# Altium integrated library Mastermind.IntLib: 985 symbols (part 4 of 6)
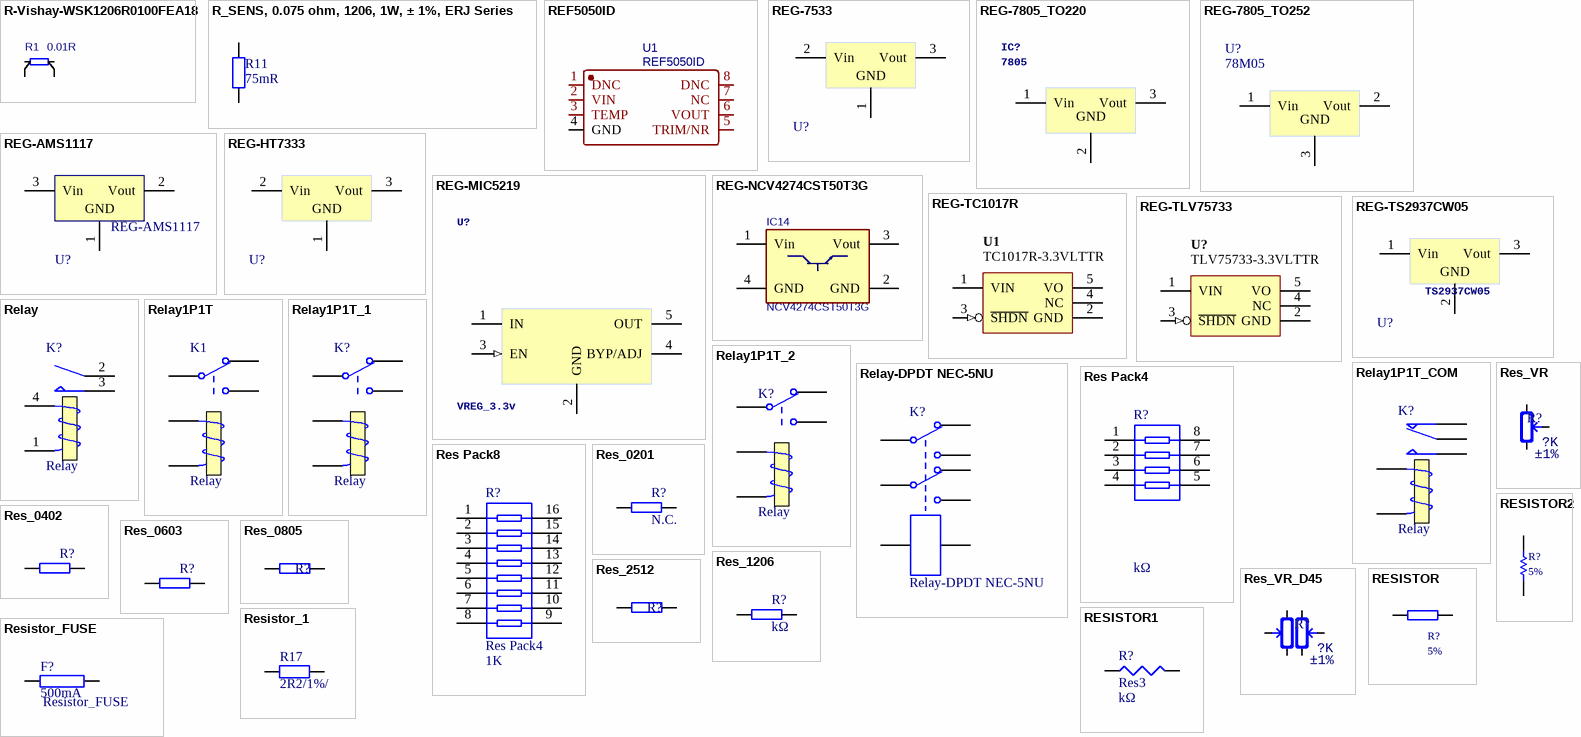
[diagram p43: symbols R-Vishay-WSK1206R0100FEA18 to Resistor_FUSE]

## Resistor_1
designator R17, comment 2R2/1%/
Resistor; MPN: MC0063W060312R2; Precision: 1%; Voltage rating: *V; Temp coefficient: *ppm; Power rating: *mW; ComponentLinknDescription: Datasheet; Resistance: 2R2; MF: Multicomp; ComponentLinknURL: *
footprint R0402 (0402 resistor)
footprint R0603 (0603 resistor)
footprint R0805 (0805 resistor)
footprint R1206 (1206 resistor)
footprint R2512 (2512 resistor)
footprint R0201 (0201 resistor)
footprint R1210 (1210 resistor)
footprint R1812 (1812 resistor)
footprint R2010 (2010 resistor)
footprint R2512 (2512 resistor)
footprint R1210
pins: 1, 2

## Resistor_FUSE
designator F?  value 500mA
footprint 0411V
footprint FUSE
footprint FUSE - Long
footprint 0207/2V
footprint Fuse-SMD
footprint 1812
footprint 0617/22
footprint F1206
footprint 0617/30
footprint 0617/50
footprint F1206 - NO
pins: 1, 2

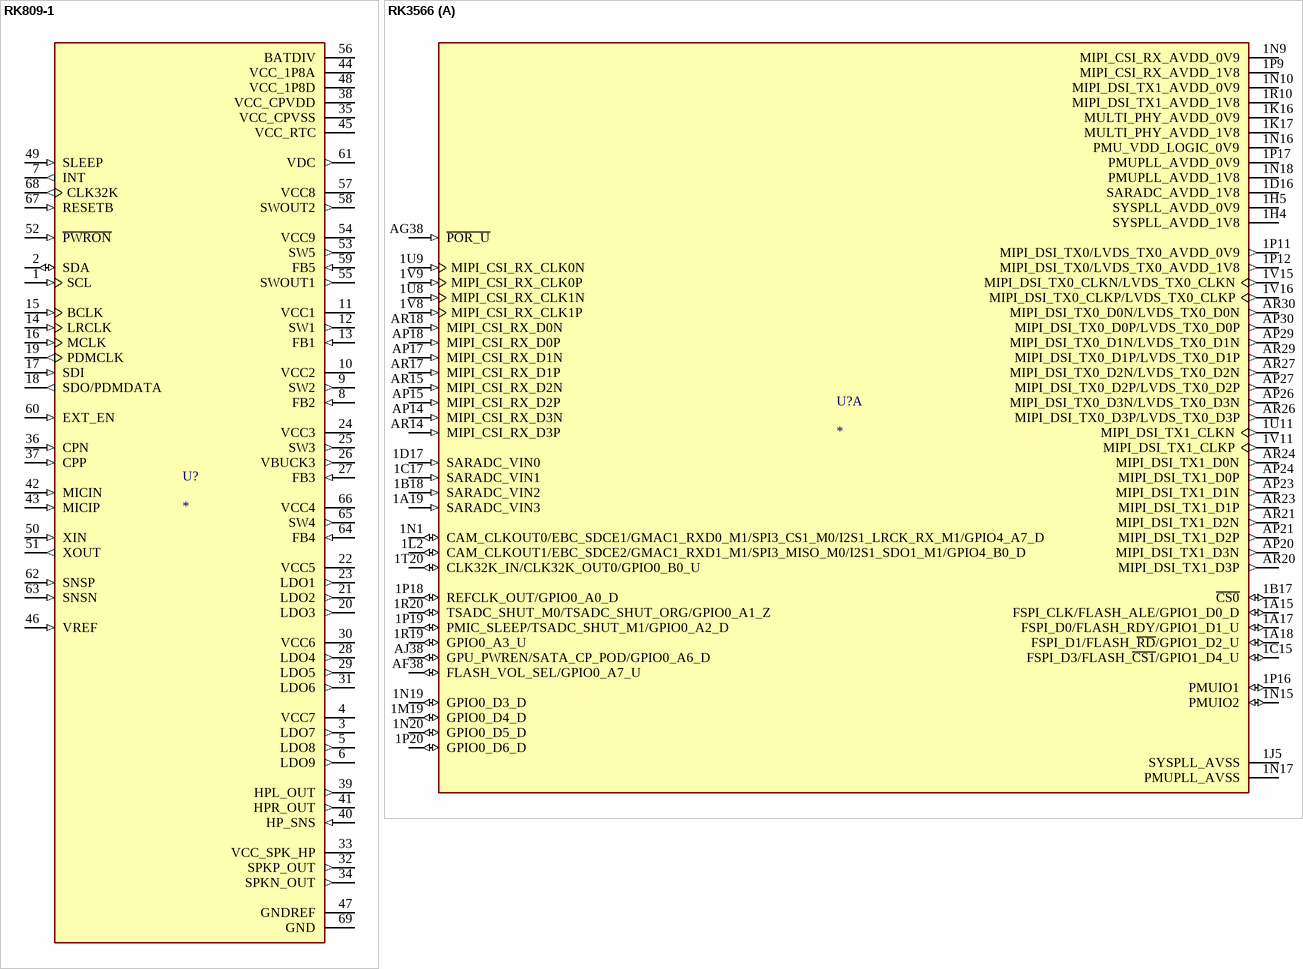
[diagram p22: symbols RK809-1 to RK3566]

## RK809-1
designator U?
Complex power-management integrated circuit (PMIC) integratedCODEC for multi-core system applications; MF: Fuzhou Rockchip Electronics Co; MP: RK809-1; Value: *; Check_prices: https://www.snapeda.com/parts/RK809-1/Fuzhou+Rockchip+Electronics+Co/view-part/?ref=eda; Price: None; Package: Package; SnapEDA_Link: https://www.snapeda.com/parts/RK809-1/Fuzhou+Rockchip+Electronics+Co/view-part/?ref=snap; Availability: Not in stock
footprint QFN35P700X700X80-69N
pins: 1 SCL (in), 2 SDA (io), 3 LDO7 (out), 4 VCC7 (power), 5 LDO8 (out), 6 LDO9 (out), 7 INT (out), 8 FB2 (in), 9 SW2 (out), 10 VCC2 (power), 11 VCC1 (power), 12 SW1 (out), 13 FB1 (in), 14 LRCLK (in), 15 BCLK (in), 16 MCLK (in), 17 SDI (in), 18 SDO/PDMDATA (out), 19 PDMCLK (out), 20 LDO3 (out), 21 LDO2 (out), 22 VCC5 (power), 23 LDO1 (out), 24 VCC3 (power), 25 SW3 (out), 26 VBUCK3 (out), 27 FB3 (in), 28 LDO4 (out), 29 LDO5 (out), 30 VCC6 (power), 31 LDO6 (out), 32 SPKP_OUT (out), 33 VCC_SPK_HP (power), 34 SPKN_OUT (out), 35 VCC_CPVSS (power), 36 CPN (in), 37 CPP (in), 38 VCC_CPVDD (power), 39 HPL_OUT (out), 40 HP_SNS (in), 41 HPR_OUT (out), 42 MICIN (in), 43 MICIP (in), 44 VCC_1P8A (power), 45 VCC_RTC (power), 46 VREF (in), 47 GNDREF (power), 48 VCC_1P8D (power), 49 SLEEP (in), 50 XIN (in), 51 XOUT (out), 52 ~{PWRON} (in), 53 SW5 (out), 54 VCC9 (power), 55 SWOUT1 (out), 56 BATDIV (power), 57 VCC8 (power), 58 SWOUT2 (out), 59 FB5 (in), 60 EXT_EN (in), 61 VDC (out), 62 SNSP (in), 63 SNSN (in), 64 FB4 (in), 65 SW4 (out), 66 VCC4 (power), 67 RESETB (in), 68 CLK32K (out), 69 GND (power)

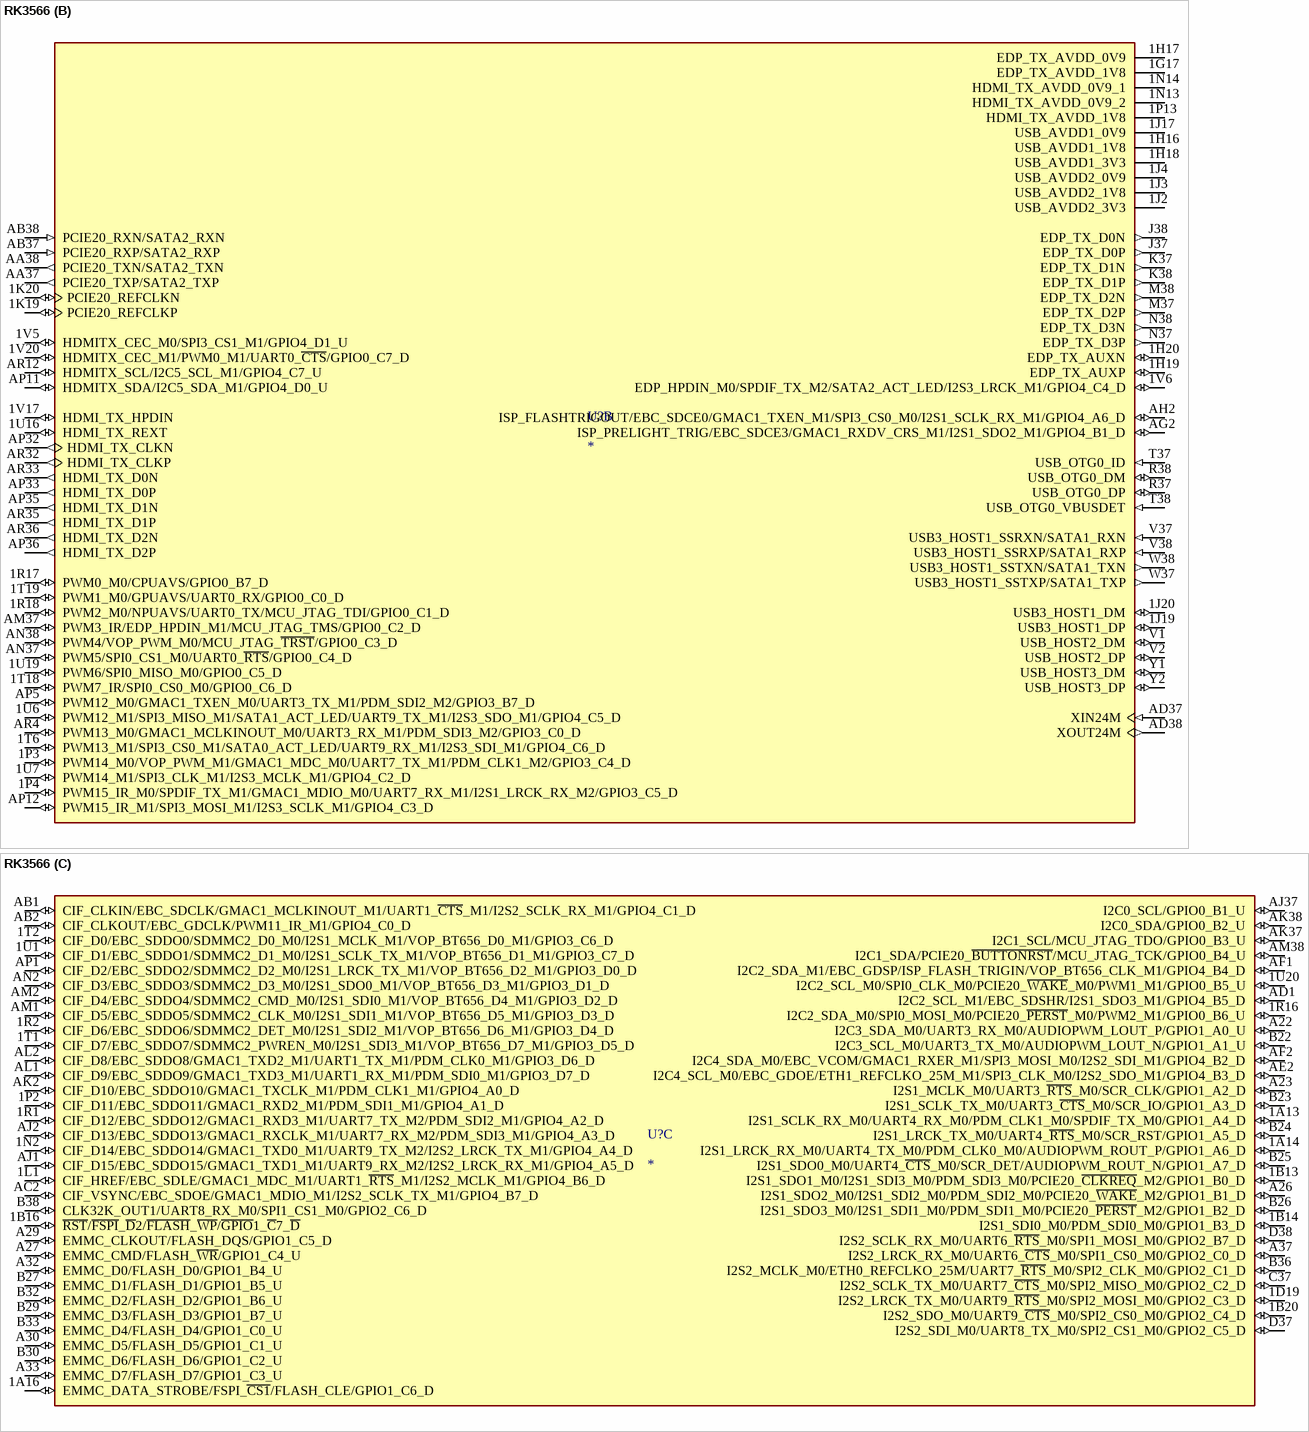
[diagram p23: symbol RK3566]

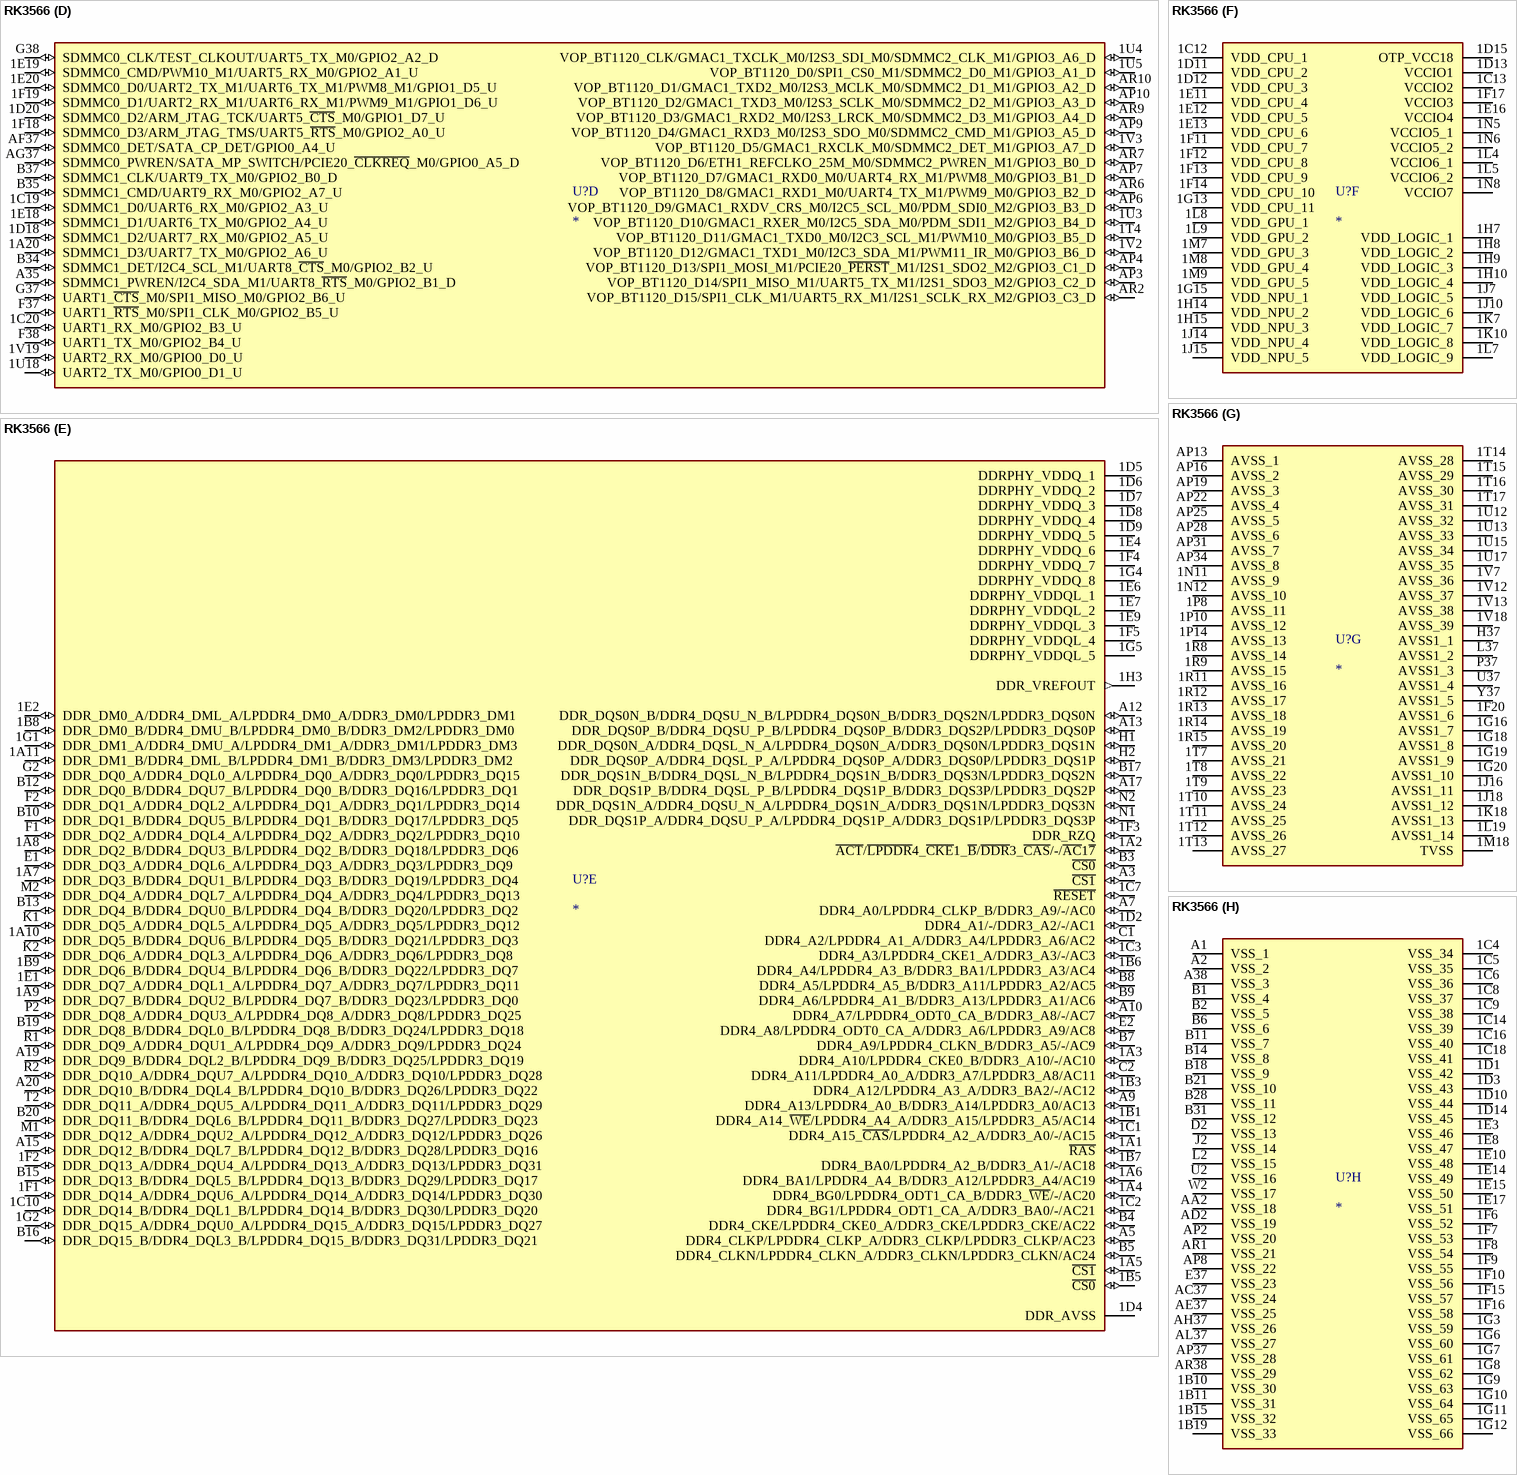
[diagram p24: symbol RK3566]

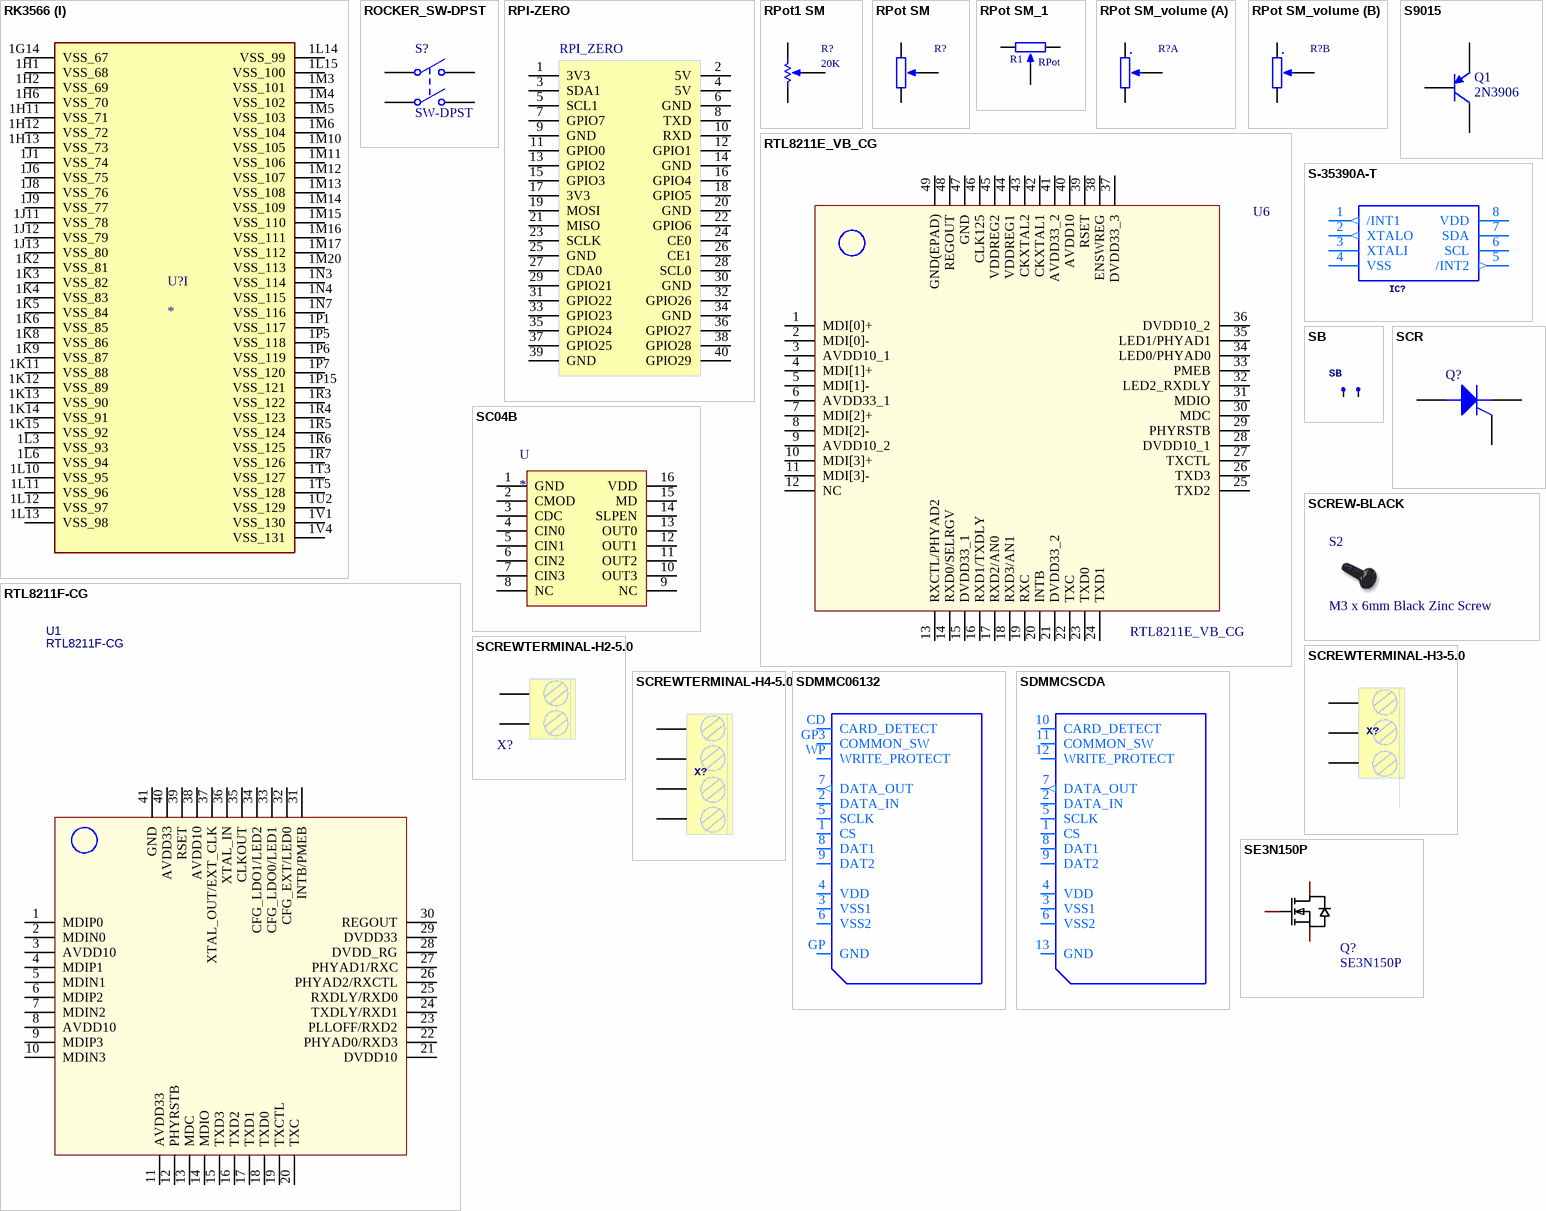
[diagram p25: symbols RK3566 to SE3N150P]

## RK3566
designator U?
high-performance and low-power quad-core application processor; MF: Fuzhou Rockchip Electronics Co; MP: RK3566; Value: *; Price: None; Package: None; Check_prices: https://www.snapeda.com/parts/RK3566/Fuzhou+Rockchip+Electronics+Co/view-part/?ref=eda; SnapEDA_Link: https://www.snapeda.com/parts/RK3566/Fuzhou+Rockchip+Electronics+Co/view-part/?ref=snap; Availability: Not in stock
footprint IC_RK3566
part A pins: 1A15 FSPI_CLK/FLASH_ALE/GPIO1_D0_D (io), 1A17 FSPI_D0/FLASH_RDY/GPIO1_D1_U (io), 1A18 FSPI_D1/FLASH_~{RD}/GPIO1_D2_U (io), 1A19 SARADC_VIN3 (in), 1B17 ~{CS0} (io), 1B18 SARADC_VIN2 (in), 1C15 FSPI_D3/FLASH_~{CS1}/GPIO1_D4_U (io), 1C17 SARADC_VIN1 (in), 1D16 SARADC_AVDD_1V8 (power), 1D17 SARADC_VIN0 (in), 1H4 SYSPLL_AVDD_1V8 (power), 1H5 SYSPLL_AVDD_0V9 (power), 1J5 SYSPLL_AVSS (power), 1K16 MULTI_PHY_AVDD_0V9 (power), 1K17 MULTI_PHY_AVDD_1V8 (power), 1L2 CAM_CLKOUT1/EBC_SDCE2/GMAC1_RXD1_M1/SPI3_MISO_M0/I2S1_SDO1_M1/GPIO4_B0_D (io), 1M19 GPIO0_D4_D (io), 1N1 CAM_CLKOUT0/EBC_SDCE1/GMAC1_RXD0_M1/SPI3_CS1_M0/I2S1_LRCK_RX_M1/GPIO4_A7_D (io), 1N9 MIPI_CSI_RX_AVDD_0V9 (power), 1N10 MIPI_DSI_TX1_AVDD_0V9 (power), 1N15 PMUIO2 (io), 1N16 PMU_VDD_LOGIC_0V9 (power), 1N17 PMUPLL_AVSS (power), 1N18 PMUPLL_AVDD_1V8 (power), 1N19 GPIO0_D3_D (io), 1N20 GPIO0_D5_D (io), 1P9 MIPI_CSI_RX_AVDD_1V8 (power), 1P11 MIPI_DSI_TX0/LVDS_TX0_AVDD_0V9 (out), 1P12 MIPI_DSI_TX0/LVDS_TX0_AVDD_1V8 (out), 1P16 PMUIO1 (io), 1P17 PMUPLL_AVDD_0V9 (power), 1P18 REFCLK_OUT/GPIO0_A0_D (io), 1P19 PMIC_SLEEP/TSADC_SHUT_M1/GPIO0_A2_D (io), 1P20 GPIO0_D6_D (io), 1R10 MIPI_DSI_TX1_AVDD_1V8 (power), 1R19 GPIO0_A3_U (io), 1R20 TSADC_SHUT_M0/TSADC_SHUT_ORG/GPIO0_A1_Z (io), 1T20 CLK32K_IN/CLK32K_OUT0/GPIO0_B0_U (io), 1U8 MIPI_CSI_RX_CLK1N (in), 1U9 MIPI_CSI_RX_CLK0N (in), 1U11 MIPI_DSI_TX1_CLKN (out), 1V8 MIPI_CSI_RX_CLK1P (in), 1V9 MIPI_CSI_RX_CLK0P (in), 1V11 MIPI_DSI_TX1_CLKP (out), 1V15 MIPI_DSI_TX0_CLKN/LVDS_TX0_CLKN (out), 1V16 MIPI_DSI_TX0_CLKP/LVDS_TX0_CLKP (out), AF38 FLASH_VOL_SEL/GPIO0_A7_U (io), AG38 ~{POR_U} (in), AJ38 GPU_PWREN/SATA_CP_POD/GPIO0_A6_D (io), AP14 MIPI_CSI_RX_D3N (in), AP15 MIPI_CSI_RX_D2P (in), AP17 MIPI_CSI_RX_D1N (in), AP18 MIPI_CSI_RX_D0P (in), AP20 MIPI_DSI_TX1_D3N (out), AP21 MIPI_DSI_TX1_D2P (out), AP23 MIPI_DSI_TX1_D1N (out), AP24 MIPI_DSI_TX1_D0P (out), AP26 MIPI_DSI_TX0_D3N/LVDS_TX0_D3N (out), AP27 MIPI_DSI_TX0_D2P/LVDS_TX0_D2P (out), AP29 MIPI_DSI_TX0_D1N/LVDS_TX0_D1N (out), AP30 MIPI_DSI_TX0_D0P/LVDS_TX0_D0P (out), AR14 MIPI_CSI_RX_D3P (in), AR15 MIPI_CSI_RX_D2N (in), AR17 MIPI_CSI_RX_D1P (in), AR18 MIPI_CSI_RX_D0N (in), AR20 MIPI_DSI_TX1_D3P (out), AR21 MIPI_DSI_TX1_D2N (out), AR23 MIPI_DSI_TX1_D1P (out), AR24 MIPI_DSI_TX1_D0N (out), AR26 MIPI_DSI_TX0_D3P/LVDS_TX0_D3P (out), AR27 MIPI_DSI_TX0_D2N/LVDS_TX0_D2N (out), AR29 MIPI_DSI_TX0_D1P/LVDS_TX0_D1P (out), AR30 MIPI_DSI_TX0_D0N/LVDS_TX0_D0N (out)
part B pins: 1G17 EDP_TX_AVDD_1V8 (power), 1H16 USB_AVDD1_1V8 (power), 1H17 EDP_TX_AVDD_0V9 (power), 1H18 USB_AVDD1_3V3 (power), 1H19 EDP_TX_AUXP (io), 1H20 EDP_TX_AUXN (io), 1J2 USB_AVDD2_3V3 (power), 1J3 USB_AVDD2_1V8 (power), 1J4 USB_AVDD2_0V9 (power), 1J17 USB_AVDD1_0V9 (power), 1J19 USB3_HOST1_DP (io), 1J20 USB3_HOST1_DM (io), 1K19 PCIE20_REFCLKP (io), 1K20 PCIE20_REFCLKN (io), 1N13 HDMI_TX_AVDD_0V9_2 (power), 1N14 HDMI_TX_AVDD_0V9_1 (power), 1P3 PWM14_M0/VOP_PWM_M1/GMAC1_MDC_M0/UART7_TX_M1/PDM_CLK1_M2/GPIO3_C4_D (io), 1P4 PWM15_IR_M0/SPDIF_TX_M1/GMAC1_MDIO_M0/UART7_RX_M1/I2S1_LRCK_RX_M2/GPIO3_C5_D (io), 1P13 HDMI_TX_AVDD_1V8 (power), 1R17 PWM0_M0/CPUAVS/GPIO0_B7_D (io), 1R18 PWM2_M0/NPUAVS/UART0_TX/MCU_JTAG_TDI/GPIO0_C1_D (io), 1T6 PWM13_M1/SPI3_CS0_M1/SATA0_ACT_LED/UART9_RX_M1/I2S3_SDI_M1/GPIO4_C6_D (io), 1T18 PWM7_IR/SPI0_CS0_M0/GPIO0_C6_D (io), 1T19 PWM1_M0/GPUAVS/UART0_RX/GPIO0_C0_D (io), 1U6 PWM12_M1/SPI3_MISO_M1/SATA1_ACT_LED/UART9_TX_M1/I2S3_SDO_M1/GPIO4_C5_D (io), 1U7 PWM14_M1/SPI3_CLK_M1/I2S3_MCLK_M1/GPIO4_C2_D (io), 1U16 HDMI_TX_REXT (io), 1U19 PWM6/SPI0_MISO_M0/GPIO0_C5_D (io), 1V5 HDMITX_CEC_M0/SPI3_CS1_M1/GPIO4_D1_U (io), 1V6 EDP_HPDIN_M0/SPDIF_TX_M2/SATA2_ACT_LED/I2S3_LRCK_M1/GPIO4_C4_D (io), 1V17 HDMI_TX_HPDIN (io), 1V20 HDMITX_CEC_M1/PWM0_M1/UART0_~{CTS}/GPIO0_C7_D (io), AA37 PCIE20_TXP/SATA2_TXP (out), AA38 PCIE20_TXN/SATA2_TXN (out), AB37 PCIE20_RXP/SATA2_RXP (in), AB38 PCIE20_RXN/SATA2_RXN (in), AD37 XIN24M (in), AD38 XOUT24M (out), AG2 ISP_PRELIGHT_TRIG/EBC_SDCE3/GMAC1_RXDV_CRS_M1/I2S1_SDO2_M1/GPIO4_B1_D (io), AH2 ISP_FLASHTRIGOUT/EBC_SDCE0/GMAC1_TXEN_M1/SPI3_CS0_M0/I2S1_SCLK_RX_M1/GPIO4_A6_D (io), AM37 PWM3_IR/EDP_HPDIN_M1/MCU_JTAG_TMS/GPIO0_C2_D (io), AN37 PWM5/SPI0_CS1_M0/UART0_~{RTS}/GPIO0_C4_D (io), AN38 PWM4/VOP_PWM_M0/MCU_JTAG_~{TRST}/GPIO0_C3_D (io), AP5 PWM12_M0/GMAC1_TXEN_M0/UART3_TX_M1/PDM_SDI2_M2/GPIO3_B7_D (io), AP11 HDMITX_SDA/I2C5_SDA_M1/GPIO4_D0_U (io), AP12 PWM15_IR_M1/SPI3_MOSI_M1/I2S3_SCLK_M1/GPIO4_C3_D (io), AP32 HDMI_TX_CLKN (out), AP33 HDMI_TX_D0P (out), AP35 HDMI_TX_D1N (out), AP36 HDMI_TX_D2P (out), AR4 PWM13_M0/GMAC1_MCLKINOUT_M0/UART3_RX_M1/PDM_SDI3_M2/GPIO3_C0_D (io), AR12 HDMITX_SCL/I2C5_SCL_M1/GPIO4_C7_U (io), AR32 HDMI_TX_CLKP (out), AR33 HDMI_TX_D0N (out), AR35 HDMI_TX_D1P (out), AR36 HDMI_TX_D2N (out), J37 EDP_TX_D0P (out), J38 EDP_TX_D0N (out), K37 EDP_TX_D1N (out), K38 EDP_TX_D1P (out), M37 EDP_TX_D2P (out), M38 EDP_TX_D2N (out), N37 EDP_TX_D3P (out), N38 EDP_TX_D3N (out), R37 USB_OTG0_DP (io), R38 USB_OTG0_DM (io), T37 USB_OTG0_ID (in), T38 USB_OTG0_VBUSDET (in), V1 USB_HOST2_DM (io), V2 USB_HOST2_DP (io), V37 USB3_HOST1_SSRXN/SATA1_RXN (in), V38 USB3_HOST1_SSRXP/SATA1_RXP (in), W37 USB3_HOST1_SSTXP/SATA1_TXP (out), W38 USB3_HOST1_SSTXN/SATA1_TXN (out), Y1 USB_HOST3_DM (io), Y2 USB_HOST3_DP (io)
part C pins: 1A13 I2S1_SCLK_RX_M0/UART4_RX_M0/PDM_CLK1_M0/SPDIF_TX_M0/GPIO1_A4_D (io), 1A14 I2S1_LRCK_RX_M0/UART4_TX_M0/PDM_CLK0_M0/AUDIOPWM_ROUT_P/GPIO1_A6_D (io), 1A16 EMMC_DATA_STROBE/FSPI_~{CS1}/FLASH_CLE/GPIO1_C6_D (io), 1B13 I2S1_SDO1_M0/I2S1_SDI3_M0/PDM_SDI3_M0/PCIE20_~{CLKREQ}_M2/GPIO1_B0_D (io), 1B14 I2S1_SDI0_M0/PDM_SDI0_M0/GPIO1_B3_D (io), 1B16 ~{RST}/~{FSPI}_~{D}2/~{FLASH}_~{WP}/~{GPIO}1_~{C}7_~{D} (io), 1B20 I2S2_SDO_M0/UART9_~{CTS}_M0/SPI2_CS0_M0/GPIO2_C4_D (io), 1D19 I2S2_LRCK_TX_M0/UART9_~{RTS}_M0/SPI2_MOSI_M0/GPIO2_C3_D (io), 1L1 CIF_HREF/EBC_SDLE/GMAC1_MDC_M1/UART1_~{RTS}_M1/I2S2_MCLK_M1/GPIO4_B6_D (io), 1N2 CIF_D14/EBC_SDDO14/GMAC1_TXD0_M1/UART9_TX_M2/I2S2_LRCK_TX_M1/GPIO4_A4_D (io), 1P2 CIF_D11/EBC_SDDO11/GMAC1_RXD2_M1/PDM_SDI1_M1/GPIO4_A1_D (io), 1R1 CIF_D12/EBC_SDDO12/GMAC1_RXD3_M1/UART7_TX_M2/PDM_SDI2_M1/GPIO4_A2_D (io), 1R2 CIF_D6/EBC_SDDO6/SDMMC2_DET_M0/I2S1_SDI2_M1/VOP_BT656_D6_M1/GPIO3_D4_D (io), 1R16 I2C2_SDA_M0/SPI0_MOSI_M0/PCIE20_~{PERST}_M0/PWM2_M1/GPIO0_B6_U (io), 1T1 CIF_D7/EBC_SDDO7/SDMMC2_PWREN_M0/I2S1_SDI3_M1/VOP_BT656_D7_M1/GPIO3_D5_D (io), 1T2 CIF_D0/EBC_SDDO0/SDMMC2_D0_M0/I2S1_MCLK_M1/VOP_BT656_D0_M1/GPIO3_C6_D (io), 1U1 CIF_D1/EBC_SDDO1/SDMMC2_D1_M0/I2S1_SCLK_TX_M1/VOP_BT656_D1_M1/GPIO3_C7_D (io), 1U20 I2C2_SCL_M0/SPI0_CLK_M0/PCIE20_~{WAKE}_M0/PWM1_M1/GPIO0_B5_U (io), A22 I2C3_SDA_M0/UART3_RX_M0/AUDIOPWM_LOUT_P/GPIO1_A0_U (io), A23 I2S1_MCLK_M0/UART3_~{RTS}_M0/SCR_CLK/GPIO1_A2_D (io), A26 I2S1_SDO2_M0/I2S1_SDI2_M0/PDM_SDI2_M0/PCIE20_~{WAKE}_M2/GPIO1_B1_D (io), A27 EMMC_CMD/FLASH_~{WR}/GPIO1_C4_U (io), A29 EMMC_CLKOUT/FLASH_DQS/GPIO1_C5_D (io), A30 EMMC_D5/FLASH_D5/GPIO1_C1_U (io), A32 EMMC_D0/FLASH_D0/GPIO1_B4_U (io), A33 EMMC_D7/FLASH_D7/GPIO1_C3_U (io), A37 I2S2_LRCK_RX_M0/UART6_~{CTS}_M0/SPI1_CS0_M0/GPIO2_C0_D (io), AB1 CIF_CLKIN/EBC_SDCLK/GMAC1_MCLKINOUT_M1/UART1_~{CTS}_M1/I2S2_SCLK_RX_M1/GPIO4_C1_D (io), AB2 CIF_CLKOUT/EBC_GDCLK/PWM11_IR_M1/GPIO4_C0_D (io), AC2 CIF_VSYNC/EBC_SDOE/GMAC1_MDIO_M1/I2S2_SCLK_TX_M1/GPIO4_B7_D (io), AD1 I2C2_SCL_M1/EBC_SDSHR/I2S1_SDO3_M1/GPIO4_B5_D (io), AE2 I2C4_SCL_M0/EBC_GDOE/ETH1_REFCLKO_25M_M1/SPI3_CLK_M0/I2S2_SDO_M1/GPIO4_B3_D (io), AF1 I2C2_SDA_M1/EBC_GDSP/ISP_FLASH_TRIGIN/VOP_BT656_CLK_M1/GPIO4_B4_D (io), AF2 I2C4_SDA_M0/EBC_VCOM/GMAC1_RXER_M1/SPI3_MOSI_M0/I2S2_SDI_M1/GPIO4_B2_D (io), AJ1 CIF_D15/EBC_SDDO15/GMAC1_TXD1_M1/UART9_RX_M2/I2S2_LRCK_RX_M1/GPIO4_A5_D (io), AJ2 CIF_D13/EBC_SDDO13/GMAC1_RXCLK_M1/UART7_RX_M2/PDM_SDI3_M1/GPIO4_A3_D (io), AJ37 I2C0_SCL/GPIO0_B1_U (io), AK2 CIF_D10/EBC_SDDO10/GMAC1_TXCLK_M1/PDM_CLK1_M1/GPIO4_A0_D (io), AK37 I2C1_SCL/MCU_JTAG_TDO/GPIO0_B3_U (io), AK38 I2C0_SDA/GPIO0_B2_U (io), AL1 CIF_D9/EBC_SDDO9/GMAC1_TXD3_M1/UART1_RX_M1/PDM_SDI0_M1/GPIO3_D7_D (io), AL2 CIF_D8/EBC_SDDO8/GMAC1_TXD2_M1/UART1_TX_M1/PDM_CLK0_M1/GPIO3_D6_D (io), AM1 CIF_D5/EBC_SDDO5/SDMMC2_CLK_M0/I2S1_SDI1_M1/VOP_BT656_D5_M1/GPIO3_D3_D (io), AM2 CIF_D4/EBC_SDDO4/SDMMC2_CMD_M0/I2S1_SDI0_M1/VOP_BT656_D4_M1/GPIO3_D2_D (io), AM38 I2C1_SDA/PCIE20_~{BUTTONRST}/MCU_JTAG_TCK/GPIO0_B4_U (io), AN2 CIF_D3/EBC_SDDO3/SDMMC2_D3_M0/I2S1_SDO0_M1/VOP_BT656_D3_M1/GPIO3_D1_D (io), AP1 CIF_D2/EBC_SDDO2/SDMMC2_D2_M0/I2S1_LRCK_TX_M1/VOP_BT656_D2_M1/GPIO3_D0_D (io), B22 I2C3_SCL_M0/UART3_TX_M0/AUDIOPWM_LOUT_N/GPIO1_A1_U (io), B23 I2S1_SCLK_TX_M0/UART3_~{CTS}_M0/SCR_IO/GPIO1_A3_D (io), B24 I2S1_LRCK_TX_M0/UART4_~{RTS}_M0/SCR_RST/GPIO1_A5_D (io), B25 I2S1_SDO0_M0/UART4_~{CTS}_M0/SCR_DET/AUDIOPWM_ROUT_N/GPIO1_A7_D (io), B26 I2S1_SDO3_M0/I2S1_SDI1_M0/PDM_SDI1_M0/PCIE20_~{PERST}_M2/GPIO1_B2_D (io), B27 EMMC_D1/FLASH_D1/GPIO1_B5_U (io), B29 EMMC_D3/FLASH_D3/GPIO1_B7_U (io), B30 EMMC_D6/FLASH_D6/GPIO1_C2_U (io), B32 EMMC_D2/FLASH_D2/GPIO1_B6_U (io), B33 EMMC_D4/FLASH_D4/GPIO1_C0_U (io), B36 I2S2_MCLK_M0/ETH0_REFCLKO_25M/UART7_~{RTS}_M0/SPI2_CLK_M0/GPIO2_C1_D (io), B38 CLK32K_OUT1/UART8_RX_M0/SPI1_CS1_M0/GPIO2_C6_D (io), C37 I2S2_SCLK_TX_M0/UART7_~{CTS}_M0/SPI2_MISO_M0/GPIO2_C2_D (io), D37 I2S2_SDI_M0/UART8_TX_M0/SPI2_CS1_M0/GPIO2_C5_D (io), D38 I2S2_SCLK_RX_M0/UART6_~{RTS}_M0/SPI1_MOSI_M0/GPIO2_B7_D (io)
part D pins: 1A20 SDMMC1_D3/UART7_TX_M0/GPIO2_A6_U (io), 1C19 SDMMC1_D0/UART6_RX_M0/GPIO2_A3_U (io), 1C20 UART1_RX_M0/GPIO2_B3_U (io), 1D18 SDMMC1_D2/UART7_RX_M0/GPIO2_A5_U (io), 1D20 SDMMC0_D2/ARM_JTAG_TCK/UART5_~{CTS}_M0/GPIO1_D7_U (io), 1E18 SDMMC1_D1/UART6_TX_M0/GPIO2_A4_U (io), 1E19 SDMMC0_CMD/PWM10_M1/UART5_RX_M0/GPIO2_A1_U (io), 1E20 SDMMC0_D0/UART2_TX_M1/UART6_TX_M1/PWM8_M1/GPIO1_D5_U (io), 1F18 SDMMC0_D3/ARM_JTAG_TMS/UART5_~{RTS}_M0/GPIO2_A0_U (io), 1F19 SDMMC0_D1/UART2_RX_M1/UART6_RX_M1/PWM9_M1/GPIO1_D6_U (io), 1T4 VOP_BT1120_D11/GMAC1_TXD0_M0/I2C3_SCL_M1/PWM10_M0/GPIO3_B5_D (io), 1U3 VOP_BT1120_D10/GMAC1_RXER_M0/I2C5_SDA_M0/PDM_SDI1_M2/GPIO3_B4_D (io), 1U4 VOP_BT1120_CLK/GMAC1_TXCLK_M0/I2S3_SDI_M0/SDMMC2_CLK_M1/GPIO3_A6_D (io), 1U5 VOP_BT1120_D0/SPI1_CS0_M1/SDMMC2_D0_M1/GPIO3_A1_D (io), 1U18 UART2_TX_M0/GPIO0_D1_U (io), 1V2 VOP_BT1120_D12/GMAC1_TXD1_M0/I2C3_SDA_M1/PWM11_IR_M0/GPIO3_B6_D (io), 1V3 VOP_BT1120_D5/GMAC1_RXCLK_M0/SDMMC2_DET_M1/GPIO3_A7_D (io), 1V19 UART2_RX_M0/GPIO0_D0_U (io), A35 SDMMC1_PWREN/I2C4_SDA_M1/UART8_~{RTS}_M0/GPIO2_B1_D (io), AF37 SDMMC0_DET/SATA_CP_DET/GPIO0_A4_U (io), AG37 SDMMC0_PWREN/SATA_MP_SWITCH/PCIE20_~{CLKREQ}_M0/GPIO0_A5_D (io), AP3 VOP_BT1120_D14/SPI1_MISO_M1/UART5_TX_M1/I2S1_SDO3_M2/GPIO3_C2_D (io), AP4 VOP_BT1120_D13/SPI1_MOSI_M1/PCIE20_~{PERST}_M1/I2S1_SDO2_M2/GPIO3_C1_D (io), AP6 VOP_BT1120_D9/GMAC1_RXDV_CRS_M0/I2C5_SCL_M0/PDM_SDI0_M2/GPIO3_B3_D (io), AP7 VOP_BT1120_D7/GMAC1_RXD0_M0/UART4_RX_M1/PWM8_M0/GPIO3_B1_D (io), AP9 VOP_BT1120_D4/GMAC1_RXD3_M0/I2S3_SDO_M0/SDMMC2_CMD_M1/GPIO3_A5_D (io), AP10 VOP_BT1120_D2/GMAC1_TXD3_M0/I2S3_SCLK_M0/SDMMC2_D2_M1/GPIO3_A3_D (io), AR2 VOP_BT1120_D15/SPI1_CLK_M1/UART5_RX_M1/I2S1_SCLK_RX_M2/GPIO3_C3_D (io), AR6 VOP_BT1120_D8/GMAC1_RXD1_M0/UART4_TX_M1/PWM9_M0/GPIO3_B2_D (io), AR7 VOP_BT1120_D6/ETH1_REFCLKO_25M_M0/SDMMC2_PWREN_M1/GPIO3_B0_D (io), AR9 VOP_BT1120_D3/GMAC1_RXD2_M0/I2S3_LRCK_M0/SDMMC2_D3_M1/GPIO3_A4_D (io), AR10 VOP_BT1120_D1/GMAC1_TXD2_M0/I2S3_MCLK_M0/SDMMC2_D1_M1/GPIO3_A2_D (io), B34 SDMMC1_DET/I2C4_SCL_M1/UART8_~{CTS}_M0/GPIO2_B2_U (io), B35 SDMMC1_CMD/UART9_RX_M0/GPIO2_A7_U (io), B37 SDMMC1_CLK/UART9_TX_M0/GPIO2_B0_D (io), F37 UART1_~{RTS}_M0/SPI1_CLK_M0/GPIO2_B5_U (io), F38 UART1_TX_M0/GPIO2_B4_U (io), G37 UART1_~{CTS}_M0/SPI1_MISO_M0/GPIO2_B6_U (io), G38 SDMMC0_CLK/TEST_CLKOUT/UART5_TX_M0/GPIO2_A2_D (io)